# Altium footprint library HARTING THD.PcbLib: 113 footprints (part 6 of 11) (continued)
## HARTING_09 33 000 9813 [mm] "Han 6E-m PCB Matrix With Contacts"
height 26
pads (6):
  round 2.5 hole 1.8: 1(0.3,10.5) 2(-2.8,5.1) 3(2.8,2.65) 4(-2.8,-2.65) 5(2.8,-5.1) 6(-0.3,-10.5)
Top Overlay:
  circle w0.2: c0.3,10.5 r2.25
  circle w0.2: c0.3,10.5 r2.6
  circle w0.2: c-2.8,5.1 r2.25
  circle w0.2: c-2.8,5.1 r2.6
  circle w0.2: c2.8,2.65 r2.25
  circle w0.2: c2.8,2.65 r2.6
  circle w0.2: c-2.8,-2.65 r2.25
  circle w0.2: c-2.8,-2.65 r2.6
  circle w0.2: c2.8,-5.1 r2.25
  circle w0.2: c2.8,-5.1 r2.6
  circle w0.2: c-0.3,-10.5 r2.25
  circle w0.2: c-0.3,-10.5 r2.6
  circle w0.2: c-5.5,13.35 r1
  lines w0.2: -7.3,-15.15 7.3,-15.15 7.3,15.15 -7.3,15.15 -7.3,-15.15
  text "1" at -4.593,9.824 h1.2
  text "6" at -5.193,-11.276 h1.2
Bottom Overlay:
  text "1" at -4.318,9.824 h1.2
  text "6" at -4.418,-11.276 h1.2
Mechanical 8:
  lines w0.1: -3.3,-2.65 -2.8,-2.65 ; -3.3,5.1 -2.8,5.1 ; -2.8,-3.15 -2.8,-2.65 ; -2.8,-2.15 -2.8,-2.65 ; -2.8,4.6 -2.8,5.1 ; -2.8,5.6 -2.8,5.1 ; -2.3,-2.65 -2.8,-2.65 ; -2.3,5.1 -2.8,5.1 ; -0.8,-10.5 -0.3,-10.5 ; -0.5,0 0,0 ; -0.3,-11 -0.3,-10.5 ; -0.3,-10 -0.3,-10.5 ; -0.2,10.5 0.3,10.5 ; 0,-0.5 0,0 ; 0,0.5 0,0 ; 0.2,-10.5 -0.3,-10.5 ; 0.3,10 0.3,10.5 ; 0.3,11 0.3,10.5 ; 0.5,0 0,0 ; 0.8,10.5 0.3,10.5 ; 2.3,-5.1 2.8,-5.1 ; 2.3,2.65 2.8,2.65 ; 2.8,-5.6 2.8,-5.1 ; 2.8,-4.6 2.8,-5.1 ; 2.8,2.15 2.8,2.65 ; 2.8,3.15 2.8,2.65 ; 3.3,-5.1 2.8,-5.1 ; 3.3,2.65 2.8,2.65
Mechanical 14:
  circle w0.1: c0.3,10.5 r2.25
  circle w0.1: c0.3,10.5 r2.6
  circle w0.1: c-2.8,5.1 r2.25
  circle w0.1: c-2.8,5.1 r2.6
  circle w0.1: c2.8,2.65 r2.25
  circle w0.1: c2.8,2.65 r2.6
  circle w0.1: c-2.8,-2.65 r2.25
  circle w0.1: c-2.8,-2.65 r2.6
  circle w0.1: c2.8,-5.1 r2.25
  circle w0.1: c2.8,-5.1 r2.6
  circle w0.1: c-0.3,-10.5 r2.25
  circle w0.1: c-0.3,-10.5 r2.6
  circle w0.1: c-5.5,13.35 r1
  lines w0.1: -7.3,-15.15 7.3,-15.15 7.3,15.15 -7.3,15.15 -7.3,-15.15
  text "1" at -4.593,9.824 h1.2
  text "6" at -5.193,-11.276 h1.2
3D body "HARTING_09 33 000 9813.stp": height 26, standoff -4.6, extent -7.3,-15.15 7.3,15.15

## HARTING_09 33 000 9815 [mm] "Han 32EE-m PCB Matrix With Contacts"
height 26
pads (26):
  round 2.5 hole 1.8: 1(-9.207,24.026) 2(-9.207,18.026) 3(-9.207,12.026) 4(-9.207,6.026) 7(-9.207,-11.974) 8(-9.207,-17.974) 9(-9.207,-23.974) 10(-3.007,22.226) 11(-3.007,14.526) 12(-3.007,6.826) 14(-3.007,-8.574) 15(-3.007,-16.274) 16(-3.007,-23.974) 17(2.993,22.226) 18(2.993,14.526) 19(2.993,6.826) 21(2.993,-8.574) 22(2.993,-16.274) 23(2.993,-23.974) 24(9.193,24.026) 25(9.193,18.026) 26(9.193,12.026) 27(9.193,6.026) 30(9.193,-11.974) 31(9.193,-17.974) 32(9.193,-23.974)
Top Overlay:
  circle w0.2: c-14.2,30.2 r1
  circle w0.2: c-9.207,18.026 r2.6
  circle w0.2: c-9.207,18.026 r2.25
  circle w0.2: c-9.207,-23.974 r2.6
  circle w0.2: c-9.207,-17.974 r2.6
  circle w0.2: c-9.207,-11.974 r2.6
  circle w0.2: c-3.007,-8.574 r2.6
  circle w0.2: c-3.007,-16.274 r2.6
  circle w0.2: c-3.007,-23.974 r2.6
  circle w0.2: c2.993,-23.974 r2.6
  circle w0.2: c2.993,-16.274 r2.6
  circle w0.2: c9.193,-23.974 r2.6
  circle w0.2: c9.193,-17.974 r2.6
  circle w0.2: c9.193,-11.974 r2.6
  circle w0.2: c2.993,-8.574 r2.6
  circle w0.2: c-9.207,6.026 r2.6
  circle w0.2: c-3.007,6.826 r2.6
  circle w0.2: c-9.207,12.026 r2.6
  circle w0.2: c-3.007,14.526 r2.6
  circle w0.2: c2.993,14.526 r2.6
  circle w0.2: c2.993,6.826 r2.6
  circle w0.2: c9.193,6.026 r2.6
  circle w0.2: c9.193,12.026 r2.6
  circle w0.2: c9.193,18.026 r2.6
  circle w0.2: c9.193,24.026 r2.6
  circle w0.2: c2.993,22.226 r2.6
  circle w0.2: c-3.007,22.226 r2.6
  circle w0.2: c-9.207,24.026 r2.6
  circle w0.2: c-9.207,24.026 r2.25
  circle w0.2: c-3.007,22.226 r2.25
  circle w0.2: c2.993,22.226 r2.25
  circle w0.2: c9.193,24.026 r2.25
  circle w0.2: c9.193,18.026 r2.25
  circle w0.2: c2.993,14.526 r2.25
  circle w0.2: c9.193,12.026 r2.25
  circle w0.2: c-3.007,14.526 r2.25
  circle w0.2: c-9.207,12.026 r2.25
  circle w0.2: c-9.207,6.026 r2.25
  circle w0.2: c-3.007,6.826 r2.25
  circle w0.2: c2.993,6.826 r2.25
  circle w0.2: c9.193,6.026 r2.25
  circle w0.2: c2.993,-8.574 r2.25
  circle w0.2: c-3.007,-8.574 r2.25
  circle w0.2: c-9.207,-11.974 r2.25
  circle w0.2: c9.193,-11.974 r2.25
  circle w0.2: c9.193,-17.974 r2.25
  circle w0.2: c2.993,-16.274 r2.25
  circle w0.2: c-3.007,-16.274 r2.25
  circle w0.2: c-9.207,-17.974 r2.25
  circle w0.2: c-9.207,-23.974 r2.25
  circle w0.2: c-3.007,-23.974 r2.25
  circle w0.2: c2.993,-23.974 r2.25
  circle w0.2: c9.193,-23.974 r2.25
  lines w0.2: -16,-32 -16,32 16,32 16,-32 -16,-32
  text "7" at -9.575,-8.101 h1.2
  text "30" at 8.225,-8.101 h1.2
  text "4" at -9.525,0.974 h1.2
  text "27" at 8.225,0.974 h1.2
  text "24" at 8.225,27.899 h1.2
  text "9" at -9.525,-29.026 h1.2
  text "32" at 8.225,-29.026 h1.2
  text "1" at -9.525,27.75 h1.2
  text "16" at -3.975,-29.026 h1.2
  text "23" at 2.025,-29.026 h1.2
  text "17" at 2.025,26.099 h1.2
  text "10" at -3.975,26.099 h1.2
  text "19" at 2.025,1.774 h1.2
  text "12" at -3.975,1.774 h1.2
  text "14" at -3.725,-4.701 h1.2
  text "21" at 2.025,-4.701 h1.2
Bottom Overlay:
  text "7" at -8.8,-8.125 h1.2
  text "30" at 9.95,-8.125 h1.2
  text "4" at -8.65,0.949 h1.2
  text "27" at 9.875,0.974 h1.2
  text "24" at 10.175,27.899 h1.2
  text "9" at -8.775,-29.026 h1.2
  text "32" at 10.1,-29.026 h1.2
  text "21" at 3.75,-4.725 h1.2
  text "14" at -2.25,-4.675 h1.2
  text "12" at -2.35,1.774 h1.2
  text "19" at 3.675,1.774 h1.2
  text "10" at -2.025,26.099 h1.2
  text "17" at 3.975,26.099 h1.2
  text "23" at 3.9,-29.026 h1.2
  text "16" at -2.275,-29.026 h1.2
  text "1" at -8.664,27.75 h1.2
Mechanical 8:
  lines w0.1: -9.707,-23.974 -9.207,-23.974 ; -9.707,-17.974 -9.207,-17.974 ; -9.707,-11.974 -9.207,-11.974 ; -9.707,6.026 -9.207,6.026 ; -9.707,12.026 -9.207,12.026 ; -9.707,18.026 -9.207,18.026 ; -9.707,24.026 -9.207,24.026 ; -9.207,-24.474 -9.207,-23.974 ; -9.207,-23.474 -9.207,-23.974 ; -9.207,-18.474 -9.207,-17.974 ; -9.207,-17.474 -9.207,-17.974 ; -9.207,-12.474 -9.207,-11.974 ; -9.207,-11.474 -9.207,-11.974 ; -9.207,5.526 -9.207,6.026 ; -9.207,6.526 -9.207,6.026 ; -9.207,11.526 -9.207,12.026 ; -9.207,12.526 -9.207,12.026 ; -9.207,17.526 -9.207,18.026 ; -9.207,18.526 -9.207,18.026 ; -9.207,23.526 -9.207,24.026 ; -9.207,24.526 -9.207,24.026 ; -8.707,-23.974 -9.207,-23.974 ; -8.707,-17.974 -9.207,-17.974 ; -8.707,-11.974 -9.207,-11.974 ; -8.707,6.026 -9.207,6.026 ; -8.707,12.026 -9.207,12.026 ; -8.707,18.026 -9.207,18.026 ; -8.707,24.026 -9.207,24.026 ; -3.507,-23.974 -3.007,-23.974 ; -3.507,-16.274 -3.007,-16.274 ; -3.507,-8.574 -3.007,-8.574 ; -3.507,6.826 -3.007,6.826 ; -3.507,14.526 -3.007,14.526 ; -3.507,22.226 -3.007,22.226 ; -3.007,-24.474 -3.007,-23.974 ; -3.007,-23.474 -3.007,-23.974 ; -3.007,-16.774 -3.007,-16.274 ; -3.007,-15.774 -3.007,-16.274 ; -3.007,-9.074 -3.007,-8.574 ; -3.007,-8.074 -3.007,-8.574 ; -3.007,6.326 -3.007,6.826 ; -3.007,7.326 -3.007,6.826 ; -3.007,14.026 -3.007,14.526 ; -3.007,15.026 -3.007,14.526 ; -3.007,21.726 -3.007,22.226 ; -3.007,22.726 -3.007,22.226 ; -2.507,-23.974 -3.007,-23.974 ; -2.507,-16.274 -3.007,-16.274 ; -2.507,-8.574 -3.007,-8.574 ; -2.507,6.826 -3.007,6.826 ; -2.507,14.526 -3.007,14.526 ; -2.507,22.226 -3.007,22.226 ; -0.5,0 0,0 ; 0,-0.5 0,0 ; 0,0.5 0,0 ; 0.5,0 0,0 ; 2.493,-23.974 2.993,-23.974 ; 2.493,-16.274 2.993,-16.274 ; 2.493,-8.574 2.993,-8.574 ; 2.493,6.826 2.993,6.826 ; 2.493,14.526 2.993,14.526 ; 2.493,22.226 2.993,22.226 ; 2.993,-24.474 2.993,-23.974 ; 2.993,-23.474 2.993,-23.974 ; 2.993,-16.774 2.993,-16.274 ; 2.993,-15.774 2.993,-16.274 ; 2.993,-9.074 2.993,-8.574 ; 2.993,-8.074 2.993,-8.574 ; 2.993,6.326 2.993,6.826 ; 2.993,7.326 2.993,6.826 ; 2.993,14.026 2.993,14.526 ; 2.993,15.026 2.993,14.526 ; 2.993,21.726 2.993,22.226 ; 2.993,22.726 2.993,22.226 ; 3.493,-23.974 2.993,-23.974 ; 3.493,-16.274 2.993,-16.274 ; 3.493,-8.574 2.993,-8.574 ; 3.493,6.826 2.993,6.826 ; 3.493,14.526 2.993,14.526 ; 3.493,22.226 2.993,22.226 ; 8.693,-23.974 9.193,-23.974 ; 8.693,-17.974 9.193,-17.974 ; 8.693,-11.974 9.193,-11.974 ; 8.693,6.026 9.193,6.026 ; 8.693,12.026 9.193,12.026 ; 8.693,18.026 9.193,18.026 ; 8.693,24.026 9.193,24.026 ; 9.193,-24.474 9.193,-23.974 ; 9.193,-23.474 9.193,-23.974 ; 9.193,-18.474 9.193,-17.974 ; 9.193,-17.474 9.193,-17.974 ; 9.193,-12.474 9.193,-11.974 ; 9.193,-11.474 9.193,-11.974 ; 9.193,5.526 9.193,6.026 ; 9.193,6.526 9.193,6.026 ; 9.193,11.526 9.193,12.026 ; 9.193,12.526 9.193,12.026 ; 9.193,17.526 9.193,18.026 ; 9.193,18.526 9.193,18.026 ; 9.193,23.526 9.193,24.026 ; 9.193,24.526 9.193,24.026 ; 9.693,-23.974 9.193,-23.974 ; 9.693,-17.974 9.193,-17.974 ; 9.693,-11.974 9.193,-11.974 ; 9.693,6.026 9.193,6.026 ; 9.693,12.026 9.193,12.026 ; 9.693,18.026 9.193,18.026 ; 9.693,24.026 9.193,24.026
Mechanical 14:
  circle w0.1: c-14.2,30.2 r1
  circle w0.1: c9.193,-11.974 r2.6
  circle w0.1: c9.193,-17.974 r2.6
  circle w0.1: c9.193,-23.974 r2.6
  circle w0.1: c2.993,-23.974 r2.6
  circle w0.1: c2.993,-16.274 r2.6
  circle w0.1: c-3.007,-16.274 r2.6
  circle w0.1: c-3.007,-23.974 r2.6
  circle w0.1: c-9.207,-23.974 r2.6
  circle w0.1: c-9.207,-17.974 r2.6
  circle w0.1: c-9.207,-11.974 r2.6
  circle w0.1: c2.993,-8.574 r2.6
  circle w0.1: c-3.007,-8.574 r2.6
  circle w0.1: c-9.207,6.026 r2.6
  circle w0.1: c-3.007,6.826 r2.6
  circle w0.1: c2.993,6.826 r2.6
  circle w0.1: c9.193,6.026 r2.6
  circle w0.1: c9.193,12.026 r2.6
  circle w0.1: c9.193,24.026 r2.6
  circle w0.1: c9.193,18.026 r2.6
  circle w0.1: c-9.207,12.026 r2.6
  circle w0.1: c2.993,14.526 r2.6
  circle w0.1: c-3.007,14.526 r2.6
  circle w0.1: c2.993,22.226 r2.6
  circle w0.1: c-3.007,22.226 r2.6
  circle w0.1: c-9.207,18.026 r2.6
  circle w0.1: c-9.207,18.026 r2.25
  circle w0.1: c-9.207,-23.974 r2.25
  circle w0.1: c-9.207,-17.974 r2.25
  circle w0.1: c-9.207,-11.974 r2.25
  circle w0.1: c-3.007,-8.574 r2.25
  circle w0.1: c-3.007,-16.274 r2.25
  circle w0.1: c-3.007,-23.974 r2.25
  circle w0.1: c2.993,-23.974 r2.25
  circle w0.1: c2.993,-16.274 r2.25
  circle w0.1: c9.193,-23.974 r2.25
  circle w0.1: c9.193,-17.974 r2.25
  circle w0.1: c9.193,-11.974 r2.25
  circle w0.1: c2.993,-8.574 r2.25
  circle w0.1: c-9.207,6.026 r2.25
  circle w0.1: c-3.007,6.826 r2.25
  circle w0.1: c-3.007,14.526 r2.25
  circle w0.1: c2.993,14.526 r2.25
  circle w0.1: c2.993,6.826 r2.25
  circle w0.1: c9.193,6.026 r2.25
  circle w0.1: c9.193,12.026 r2.25
  circle w0.1: c9.193,18.026 r2.25
  circle w0.1: c9.193,24.026 r2.25
  circle w0.1: c2.993,22.226 r2.25
  circle w0.1: c-3.007,22.226 r2.25
  circle w0.1: c-9.207,24.026 r2.6
  circle w0.1: c-9.207,24.026 r2.25
  circle w0.1: c-9.207,12.026 r2.25
  lines w0.1: -16,-32 -16,32 16,32 16,-32 -16,-32
  text "7" at -9.575,-8.101 h1.2
  text "30" at 8.225,-8.101 h1.2
  text "4" at -9.525,0.974 h1.2
  text "27" at 8.225,0.974 h1.2
  text "24" at 8.225,27.899 h1.2
  text "9" at -9.525,-29.026 h1.2
  text "32" at 8.225,-29.026 h1.2
  text "1" at -9.525,27.75 h1.2
  text "16" at -3.975,-29.026 h1.2
  text "23" at 2.025,-29.026 h1.2
  text "17" at 2.025,26.099 h1.2
  text "10" at -3.975,26.099 h1.2
  text "19" at 2.025,1.774 h1.2
  text "12" at -3.975,1.774 h1.2
  text "14" at -3.725,-4.701 h1.2
  text "21" at 2.025,-4.701 h1.2
3D body "HARTING_09 33 000 9815.stp": height 26, standoff -4.6, extent -16,-32 16,32

## HARTING_09 33 000 9996 [mm] "6 Positions, PC Board Adaptor For Han E® Module"
height 23
pads (2):
  round 2.5 hole 1.8: 1(-3.75,0) 2(3.75,0)
Top Overlay:
  circle w0.2: c3.75,0 r2.25
  circle w0.2: c3.75,0 r2.45
  circle w0.2: c-3.75,0 r2.25
  circle w0.2: c-3.75,0 r2.45
  lines w0.2: -8.727,-4.285 cw(c-8.65,-4.1) -8.727,-3.915 ; -8.4,-3.35 -8.4,-3.466 ; -8.1,-3.35 -8.1,-3.661 ; -7.9,-3.35 -7.9,-3.661 ; -7.6,-3.35 -7.6,-3.466 ; -7.273,-4.285 ccw(c-7.35,-4.1) -7.273,-3.915 ; -6.45,3.35 -6.45,4.35 -1.75,4.35 -1.75,3.35 ; 1.75,3.35 1.75,4.35 6.45,4.35 6.45,3.35 ; 7.273,-4.285 cw(c7.35,-4.1) 7.273,-3.915 ; 7.6,-3.35 7.6,-3.466 ; 7.9,-3.35 7.9,-3.661 ; 8.1,-3.35 8.1,-3.661 ; 8.4,-3.35 8.4,-3.466 ; 8.727,-4.285 ccw(c8.65,-4.1) 8.727,-3.915 ; -8.4,-3.466 cw(c-9.479,-5.447) -8.1,-3.661 ; -8.4,-3.466 ccw(c-8,-4.1) -7.6,-3.466 ; -8.1,-3.661 ccw(c-8,-4.1) -7.9,-3.661 ; -7.9,-3.661 cw(c-6.785,-5.043) -7.6,-3.466 ; 7.6,-3.466 cw(c6.785,-5.043) 7.9,-3.661 ; 7.6,-3.466 ccw(c8,-4.1) 8.4,-3.466 ; 7.9,-3.661 ccw(c8,-4.1) 8.1,-3.661 ; 8.1,-3.661 cw(c9.479,-5.447) 8.4,-3.466 ; -13,-3.35 -13,3.35 13,3.35 13,-3.35 -13,-3.35
  text "1" at -7.3,-0.6 h1.2
Mechanical 8:
  lines w0.1: -4.25,0 -3.75,0 ; -3.75,-0.5 -3.75,0 ; -3.75,0.5 -3.75,0 ; -3.25,0 -3.75,0 ; -0.5,0 0,0 ; 0,-0.5 0,0 ; 0,0.5 0,0 ; 0.5,0 0,0 ; 3.25,0 3.75,0 ; 3.75,-0.5 3.75,0 ; 3.75,0.5 3.75,0 ; 4.25,0 3.75,0
Mechanical 14:
  circle w0.1: c3.75,0 r1.35
  circle w0.1: c3.75,0 r2.25
  circle w0.1: c3.75,0 r2.45
  circle w0.1: c3.75,0 r1.25
  circle w0.1: c-3.75,0 r1.35
  circle w0.1: c-3.75,0 r2.25
  circle w0.1: c-3.75,0 r2.45
  circle w0.1: c-3.75,0 r1.25
  lines w0.1: -8.727,-4.285 cw(c-8.65,-4.1) -8.727,-3.915 ; -8.4,-3.35 -8.4,-3.466 ; -8.1,-3.35 -8.1,-3.661 ; -7.9,-3.35 -7.9,-3.661 ; -7.6,-3.35 -7.6,-3.466 ; -7.273,-4.285 ccw(c-7.35,-4.1) -7.273,-3.915 ; -6.45,3.35 -6.45,4.35 -1.75,4.35 -1.75,3.35 ; 1.75,3.35 1.75,4.35 6.45,4.35 6.45,3.35 ; 7.273,-4.285 cw(c7.35,-4.1) 7.273,-3.915 ; 7.6,-3.35 7.6,-3.466 ; 7.9,-3.35 7.9,-3.661 ; 8.1,-3.35 8.1,-3.661 ; 8.4,-3.35 8.4,-3.466 ; 8.727,-4.285 ccw(c8.65,-4.1) 8.727,-3.915 ; -8.4,-3.466 cw(c-9.479,-5.447) -8.1,-3.661 ; -8.4,-3.466 ccw(c-8,-4.1) -7.6,-3.466 ; -8.1,-3.661 ccw(c-8,-4.1) -7.9,-3.661 ; -7.9,-3.661 cw(c-6.785,-5.043) -7.6,-3.466 ; 7.6,-3.466 cw(c6.785,-5.043) 7.9,-3.661 ; 7.6,-3.466 ccw(c8,-4.1) 8.4,-3.466 ; 7.9,-3.661 ccw(c8,-4.1) 8.1,-3.661 ; 8.1,-3.661 cw(c9.479,-5.447) 8.4,-3.466 ; -13,-3.35 -13,3.35 13,3.35 13,-3.35 -13,-3.35
  text "1" at -7.3,-0.6 h1.2
3D body "HARTING_09 33 000 9996.stp": height 23, standoff -4.6, extent -13,-4.85 13,4.35

## HARTING_09 56 551 7513 [mm] "High Density Straight Female D-SUB 78 Contacts, with Grounding Board Locks and Female Screw Lock 4-40"
height 12.7
pads (80):
  round 1.7 hole 1: 1(22.895,3.12) 2(20.485,3.12) 3(18.075,3.12) 4(15.665,3.12) 5(13.255,3.12) 6(10.845,3.12) 7(8.435,3.12) 8(6.025,3.12) 9(3.615,3.12) 10(1.205,3.12) 11(-1.205,3.12) 12(-3.615,3.12) 13(-6.025,3.12) 14(-8.435,3.12) 15(-10.845,3.12) 16(-13.255,3.12) 17(-15.665,3.12) 18(-18.075,3.12) 19(-20.485,3.12) 20(-22.895,3.12) 21(21.695,1.04) 22(19.285,1.04) 23(16.875,1.04) 24(14.465,1.04) 25(12.055,1.04) 26(9.645,1.04) 27(7.235,1.04) 28(4.825,1.04) 29(2.415,1.04) 30(0.005,1.04) 31(-2.405,1.04) 32(-4.815,1.04) 33(-7.225,1.04) 34(-9.635,1.04) 35(-12.045,1.04) 36(-14.455,1.04) 37(-16.865,1.04) 38(-19.275,1.04) 39(-21.685,1.04) 40(22.895,-1.04) 41(20.485,-1.04) 42(18.075,-1.04) 43(15.665,-1.04) 44(13.255,-1.04) 45(10.845,-1.04) 46(8.435,-1.04) 47(6.025,-1.04) 48(3.615,-1.04) 49(1.205,-1.04) 50(-1.205,-1.04) 51(-3.615,-1.04) 52(-6.025,-1.04) 53(-8.435,-1.04) 54(-10.845,-1.04) 55(-13.255,-1.04) 56(-15.665,-1.04) 57(-18.075,-1.04) 58(-20.485,-1.04) 59(-22.895,-1.04) 60(21.695,-3.12) 61(19.285,-3.12) 62(16.875,-3.12) 63(14.465,-3.12) 64(12.055,-3.12) 65(9.645,-3.12) 66(7.235,-3.12) 67(4.825,-3.12) 68(2.415,-3.12) 69(0.005,-3.12) 70(-2.405,-3.12) 71(-4.815,-3.12) 72(-7.225,-3.12) 73(-9.635,-3.12) 74(-12.045,-3.12) 75(-14.455,-3.12) 76(-16.865,-3.12) 77(-19.275,-3.12) 78(-21.685,-3.12)
  round 3.8 hole 3.1: 79(-30.55,0) 80(30.55,0)
Top Overlay:
  circle w0.2: c22.67,8.5 r0.125
  lines w0.2: -33.655,-6.375 ccw(c-32.155,-6.375) -32.155,-7.875 32.145,-7.875 ccw(c32.145,-6.375) 33.645,-6.375 33.645,6.375 ccw(c32.145,6.375) 32.145,7.875 -32.155,7.875 ccw(c-32.155,6.375) -33.655,6.375 -33.655,-6.375 ; -33.153,0 -31.854,2.25 -29.256,2.25 -27.957,0 -29.256,-2.25 -31.854,-2.25 -33.153,0 ; -26.181,2.319 cw(c-23.62,2.77) -23.62,5.37 23.61,5.37 cw(c23.61,2.77) 26.171,2.319 25.194,-3.221 cw(c22.633,-2.77) 22.633,-5.37 -22.643,-5.37 cw(c-22.643,-2.77) -25.204,-3.221 -26.181,2.319 ; -25.688,2.405 cw(c-23.62,2.77) -23.62,4.87 23.61,4.87 cw(c23.61,2.77) 25.678,2.405 24.701,-3.135 cw(c22.633,-2.77) 22.633,-4.87 -22.643,-4.87 cw(c-22.643,-2.77) -24.711,-3.135 -25.688,2.405 ; 27.947,0 29.246,-2.25 31.844,-2.25 33.143,0 31.844,2.25 29.246,2.25 27.947,0
  text "78" at -28.054,-4.032 h1.2
  text "60" at 26.246,-3.782 h1.2
  text "1" at 27.121,3.148 h1.2
  text "20" at -28.795,3.15 h1.2
Mechanical 8:
  drawing of 328 lines, arcs and shapes, not listed
Mechanical 14:
  drawing of 192 lines, arcs and shapes, not listed
  text "78" at -28.054,-4.032 h1.2
  text "1" at 27.121,3.148 h1.2
  text "60" at 26.246,-3.782 h1.2
3D body "HARTING_09 56 551 7513.stp": height 13.25, standoff -3.5, extent -33.655,-7.875 33.645,7.875

## HARTING_09 56 552 7613 [mm] "High Density Right Angle Female D-SUB 78 Contacts, with Grounding Board Locks and Female Screw Lock 4-40"
height 15.35
pads (80):
  round 1.7 hole 1: 1(-22.895,-3.81) 2(-20.485,-3.81) 3(-18.075,-3.81) 4(-15.665,-3.81) 5(-13.255,-3.81) 6(-10.845,-3.81) 7(-8.435,-3.81) 8(-6.025,-3.81) 9(-3.615,-3.81) 10(-1.205,-3.81) 11(1.205,-3.81) 12(3.615,-3.81) 13(6.025,-3.81) 14(8.435,-3.81) 15(10.845,-3.81) 16(13.255,-3.81) 17(15.665,-3.81) 18(18.075,-3.81) 19(20.485,-3.81) 20(22.895,-3.81) 21(-21.685,-1.27) 22(-19.275,-1.27) 23(-16.865,-1.27) 24(-14.455,-1.27) 25(-12.045,-1.27) 26(-9.635,-1.27) 27(-7.225,-1.27) 28(-4.815,-1.27) 29(-2.405,-1.27) 30(0.005,-1.27) 31(2.415,-1.27) 32(4.825,-1.27) 33(7.235,-1.27) 34(9.645,-1.27) 35(12.055,-1.27) 36(14.465,-1.27) 37(16.875,-1.27) 38(19.285,-1.27) 39(21.695,-1.27) 40(-22.895,1.27) 41(-20.485,1.27) 42(-18.075,1.27) 43(-15.665,1.27) 44(-13.255,1.27) 45(-10.845,1.27) 46(-8.435,1.27) 47(-6.025,1.27) 48(-3.615,1.27) 49(-1.205,1.27) 50(1.205,1.27) 51(3.615,1.27) 52(6.025,1.27) 53(8.435,1.27) 54(10.845,1.27) 55(13.255,1.27) 56(15.665,1.27) 57(18.075,1.27) 58(20.485,1.27) 59(22.895,1.27) 60(-21.685,3.81) 61(-19.275,3.81) 62(-16.865,3.81) 63(-14.455,3.81) 64(-12.045,3.81) 65(-9.635,3.81) 66(-7.225,3.81) 67(-4.815,3.81) 68(-2.405,3.81) 69(0.005,3.81) 70(2.415,3.81) 71(4.825,3.81) 72(7.235,3.81) 73(9.645,3.81) 74(12.055,3.81) 75(14.465,3.81) 76(16.875,3.81) 77(19.285,3.81) 78(21.695,3.81)
  round 4.1 hole 3.4: 79(-30.555,1.27) 80(30.565,1.27)
Top Overlay:
  circle w0.2: c-22.895,-6.01 r0.125
  lines w0.2: -33.695,7.7 -27.245,7.7 ; -33.695,9.7 33.705,9.7 ; -33.668,12.2 33.705,12.2 ; -33.35,7.7 -33.35,4.02 ccw(c-32.35,4.02) -32.35,3.02 ; -33.143,12.7 -33.143,18.7 -27.947,18.7 -27.947,12.7 ; -32.35,-5.4 -32.35,-0.397 ; -31.945,7.7 -31.945,6.5 ; -29.145,7.7 -29.145,6.5 ; -28.75,-5.4 -28.75,-0.387 ; -28.75,3.02 ccw(c-28.75,4.02) -27.75,4.02 -27.75,7.7 ; -27.245,-5.4 -27.245,9.7 ; -26.172,12.7 -26.172,18.3 cw(c-25.672,18.3) -25.672,18.8 25.682,18.8 cw(c25.682,18.3) 26.182,18.3 26.182,12.7 ; 27.255,-5.4 27.255,9.7 ; 27.255,7.7 33.705,7.7 ; 27.77,7.7 27.77,4.02 ccw(c28.77,4.02) 28.77,3.02 ; 27.957,12.7 27.957,18.7 33.153,18.7 33.153,12.7 ; 28.77,-5.4 28.77,-0.397 ; 29.175,7.7 29.175,6.5 ; 31.975,7.7 31.975,6.5 ; 32.37,-5.4 32.37,-0.387 ; 32.37,3.02 ccw(c32.37,4.02) 33.37,4.02 33.37,7.7 ; -31.945,6.5 -31.645,6.2 -29.445,6.2 -29.145,6.5 ; -31.945,6.5 -29.145,6.5 ; 29.175,6.5 29.475,6.2 31.675,6.2 31.975,6.5 ; 29.175,6.5 31.975,6.5 ; -33.695,-5.4 33.705,-5.4 33.705,12.7 -33.695,12.7 -33.695,-5.4
  text "1" at -26.554,-4.377 h1.2
  text "40" at -26.554,0.703 h1.2
  text "60" at -26.604,3.153 h1.2
  text "21" at -26.604,-1.927 h1.2
  text "39" at 24.621,-1.897 h1.2
  text "20" at 24.696,-4.437 h1.2
  text "59" at 24.696,0.643 h1.2
  text "78" at 24.621,3.183 h1.2
Mechanical 8:
  drawing of 326 lines, arcs and shapes, not listed
Mechanical 14:
  lines w0.1: -33.695,7.7 -27.245,7.7 ; -33.695,9.7 33.705,9.7 ; -33.668,12.2 33.705,12.2 ; -33.35,7.7 -33.35,4.02 ccw(c-32.35,4.02) -32.35,3.02 ; -33.143,12.7 -33.143,18.7 -27.947,18.7 -27.947,12.7 ; -32.35,-5.4 -32.35,3.02 ; -32.35,0.55 ccw(c-30.55,0.55) -28.75,0.55 ; -32.35,2.05 cw(c-30.55,2.05) -32.066,3.02 ; -32.06,1.47 -32.255,1.47 -32.255,1.07 -32.06,1.07 ; -32.06,3.02 -32.06,1.07 ; -31.945,7.7 -31.945,6.5 ; -29.145,7.7 -29.145,6.5 ; -29.04,1.47 -28.835,1.47 -28.835,1.07 -29.04,1.07 ; -29.04,3.02 -29.04,1.07 ; -29.034,3.02 cw(c-30.55,2.05) -28.75,2.05 ; -28.75,-5.4 -28.75,3.02 ; -27.75,7.7 -27.75,4.02 cw(c-28.75,4.02) -28.75,3.02 ; -27.245,-5.4 -27.245,9.7 ; -26.172,12.7 -26.172,18.3 cw(c-25.672,18.3) -25.672,18.8 25.682,18.8 cw(c25.682,18.3) 26.182,18.3 26.182,12.7 ; 27.255,-5.4 27.255,9.7 ; 27.255,7.7 33.705,7.7 ; 27.77,7.7 27.77,4.02 ccw(c28.77,4.02) 28.77,3.02 ; 27.957,12.7 27.957,18.7 33.153,18.7 33.153,12.7 ; 28.77,-5.4 28.77,3.02 ; 28.77,0.55 ccw(c30.57,0.55) 32.37,0.55 ; 28.77,2.05 cw(c30.57,2.05) 29.054,3.02 ; 29.06,1.47 28.865,1.47 28.865,1.07 29.06,1.07 ; 29.06,3.02 29.06,1.07 ; 29.175,7.7 29.175,6.5 ; 31.975,7.7 31.975,6.5 ; 32.08,1.47 32.285,1.47 32.285,1.07 32.08,1.07 ; 32.08,3.02 32.08,1.07 ; 32.086,3.02 cw(c30.57,2.05) 32.37,2.05 ; 32.37,-5.4 32.37,3.02 ; 33.37,7.7 33.37,4.02 cw(c32.37,4.02) 32.37,3.02 ; -32.35,3.02 -28.75,3.02 ; -32.06,1.07 -29.04,1.07 ; -31.945,6.5 -31.645,6.2 -29.445,6.2 -29.145,6.5 ; -31.945,6.5 -29.145,6.5 ; 28.77,3.02 32.37,3.02 ; 29.06,1.07 32.08,1.07 ; 29.175,6.5 29.475,6.2 31.675,6.2 31.975,6.5 ; 29.175,6.5 31.975,6.5 ; -33.695,-5.4 33.705,-5.4 33.705,12.7 -33.695,12.7 -33.695,-5.4
  text "40" at -26.554,0.703 h1.2
  text "60" at -26.604,3.153 h1.2
  text "21" at -26.604,-1.927 h1.2
  text "39" at 24.621,-1.897 h1.2
  text "20" at 24.696,-4.437 h1.2
  text "59" at 24.696,0.643 h1.2
  text "78" at 24.621,3.183 h1.2
  text "1" at -26.554,-4.377 h1.2
3D body "HARTING_ 09 56 552 7613.stp": height 15.75, standoff -4, extent -33.695,-5.4 33.705,18.8

## HARTING_09 56 561 7713 [mm] "High Density Straight Male D-SUB 78 Contacts, with Grounding Board Locks and Female Screw Lock 4-40"
height 13.1
pads (80):
  round 1.7 hole 1: 1(-22.9,3.12) 2(-20.49,3.12) 3(-18.08,3.12) 4(-15.67,3.12) 5(-13.26,3.12) 6(-10.85,3.12) 7(-8.44,3.12) 8(-6.03,3.12) 9(-3.62,3.12) 10(-1.21,3.12) 11(1.2,3.12) 12(3.61,3.12) 13(6.02,3.12) 14(8.43,3.12) 15(10.84,3.12) 16(13.25,3.12) 17(15.66,3.12) 18(18.07,3.12) 19(20.48,3.12) 20(22.89,3.12) 21(-21.69,1.04) 22(-19.28,1.04) 23(-16.87,1.04) 24(-14.46,1.04) 25(-12.05,1.04) 26(-9.64,1.04) 27(-7.23,1.04) 28(-4.82,1.04) 29(-2.41,1.04) 30(0,1.04) 31(2.41,1.04) 32(4.82,1.04) 33(7.23,1.04) 34(9.64,1.04) 35(12.05,1.04) 36(14.46,1.04) 37(16.87,1.04) 38(19.28,1.04) 39(21.69,1.04) 40(-22.9,-1.04) 41(-20.49,-1.04) 42(-18.08,-1.04) 43(-15.67,-1.04) 44(-13.26,-1.04) 45(-10.85,-1.04) 46(-8.44,-1.04) 47(-6.03,-1.04) 48(-3.62,-1.04) 49(-1.21,-1.04) 50(1.2,-1.04) 51(3.61,-1.04) 52(6.02,-1.04) 53(8.43,-1.04) 54(10.84,-1.04) 55(13.25,-1.04) 56(15.66,-1.04) 57(18.07,-1.04) 58(20.48,-1.04) 59(22.89,-1.04) 60(-21.69,-3.12) 61(-19.28,-3.12) 62(-16.87,-3.12) 63(-14.46,-3.12) 64(-12.05,-3.12) 65(-9.64,-3.12) 66(-7.23,-3.12) 67(-4.82,-3.12) 68(-2.41,-3.12) 69(0,-3.12) 70(2.41,-3.12) 71(4.82,-3.12) 72(7.23,-3.12) 73(9.64,-3.12) 74(12.05,-3.12) 75(14.46,-3.12) 76(16.87,-3.12) 77(19.28,-3.12) 78(21.69,-3.12)
  round 3.8 hole 3.1: 79(-30.55,0) 80(30.55,0)
Top Overlay:
  circle w0.2: c-23.125,8.5 r0.125
  lines w0.2: -33.65,-6.375 ccw(c-32.15,-6.375) -32.15,-7.875 32.15,-7.875 ccw(c32.15,-6.375) 33.65,-6.375 33.65,6.375 ccw(c32.15,6.375) 32.15,7.875 -32.15,7.875 ccw(c-32.15,6.375) -33.65,6.375 -33.65,-6.375 ; -33.148,0 -31.849,-2.25 -29.251,-2.25 -27.952,0 -29.251,2.25 -31.849,2.25 -33.148,0 ; -26.933,2.522 cw(c-23.88,3.06) -23.88,6.16 23.88,6.16 cw(c23.88,3.06) 26.933,2.522 25.854,-3.598 cw(c22.801,-3.06) 22.801,-6.16 -22.801,-6.16 cw(c-22.801,-3.06) -25.854,-3.598 -26.933,2.522 ; -26.44,2.609 cw(c-23.88,3.06) -23.88,5.66 23.88,5.66 cw(c23.88,3.06) 26.441,2.609 25.361,-3.511 cw(c22.801,-3.06) 22.801,-5.66 -22.801,-5.66 cw(c-22.801,-3.06) -25.361,-3.511 -26.44,2.609 ; 27.952,0 29.251,-2.25 31.849,-2.25 33.148,0 31.849,2.25 29.251,2.25 27.952,0
  text "20" at 27.771,3.038 h1.2
  text "78" at 26.821,-3.917 h1.2
  text "1" at -28.1,2.5 h1.2
  text "60" at -28.75,-4.125 h1.2
Mechanical 8:
  drawing of 329 lines, arcs and shapes, not listed
Mechanical 14:
  circle w0.1: c-22.9,3.12 r0.35
  circle w0.1: c-21.69,1.04 r0.35
  circle w0.1: c-22.9,-1.04 r0.35
  circle w0.1: c-21.69,-3.12 r0.35
  circle w0.1: c-20.49,3.12 r0.35
  circle w0.1: c-19.28,1.04 r0.35
  circle w0.1: c-20.49,-1.04 r0.35
  circle w0.1: c-19.28,-3.12 r0.35
  circle w0.1: c-18.08,3.12 r0.35
  circle w0.1: c-16.87,1.04 r0.35
  circle w0.1: c-18.08,-1.04 r0.35
  circle w0.1: c-16.87,-3.12 r0.35
  circle w0.1: c-15.67,3.12 r0.35
  circle w0.1: c-14.46,1.04 r0.35
  circle w0.1: c-15.67,-1.04 r0.35
  circle w0.1: c-14.46,-3.12 r0.35
  circle w0.1: c-13.26,3.12 r0.35
  circle w0.1: c-12.05,1.04 r0.35
  circle w0.1: c-13.26,-1.04 r0.35
  circle w0.1: c-12.05,-3.12 r0.35
  circle w0.1: c-10.85,3.12 r0.35
  circle w0.1: c-9.64,1.04 r0.35
  circle w0.1: c-10.85,-1.04 r0.35
  circle w0.1: c-9.64,-3.12 r0.35
  circle w0.1: c-8.44,3.12 r0.35
  circle w0.1: c-7.23,1.04 r0.35
  circle w0.1: c-8.44,-1.04 r0.35
  circle w0.1: c-7.23,-3.12 r0.35
  circle w0.1: c-6.03,3.12 r0.35
  circle w0.1: c-4.82,1.04 r0.35
  circle w0.1: c-6.03,-1.04 r0.35
  circle w0.1: c-4.82,-3.12 r0.35
  circle w0.1: c-3.62,3.12 r0.35
  circle w0.1: c-2.41,1.04 r0.35
  circle w0.1: c-3.62,-1.04 r0.35
  circle w0.1: c-2.41,-3.12 r0.35
  circle w0.1: c-1.21,3.12 r0.35
  circle w0.1: c0,1.04 r0.35
  circle w0.1: c-1.21,-1.04 r0.35
  circle w0.1: c0,-3.12 r0.35
  circle w0.1: c1.2,3.12 r0.35
  circle w0.1: c2.41,1.04 r0.35
  circle w0.1: c1.2,-1.04 r0.35
  circle w0.1: c2.41,-3.12 r0.35
  circle w0.1: c3.61,3.12 r0.35
  circle w0.1: c4.82,1.04 r0.35
  circle w0.1: c3.61,-1.04 r0.35
  circle w0.1: c4.82,-3.12 r0.35
  circle w0.1: c6.02,3.12 r0.35
  circle w0.1: c7.23,1.04 r0.35
  circle w0.1: c6.02,-1.04 r0.35
  circle w0.1: c7.23,-3.12 r0.35
  circle w0.1: c8.43,3.12 r0.35
  circle w0.1: c9.64,1.04 r0.35
  circle w0.1: c8.43,-1.04 r0.35
  circle w0.1: c9.64,-3.12 r0.35
  circle w0.1: c10.84,3.12 r0.35
  circle w0.1: c12.05,1.04 r0.35
  circle w0.1: c10.84,-1.04 r0.35
  circle w0.1: c12.05,-3.12 r0.35
  circle w0.1: c13.25,3.12 r0.35
  circle w0.1: c14.46,1.04 r0.35
  circle w0.1: c13.25,-1.04 r0.35
  circle w0.1: c14.46,-3.12 r0.35
  circle w0.1: c15.66,3.12 r0.35
  circle w0.1: c16.87,1.04 r0.35
  circle w0.1: c15.66,-1.04 r0.35
  circle w0.1: c16.87,-3.12 r0.35
  circle w0.1: c18.07,3.12 r0.35
  circle w0.1: c19.28,1.04 r0.35
  circle w0.1: c18.07,-1.04 r0.35
  circle w0.1: c19.28,-3.12 r0.35
  circle w0.1: c20.48,3.12 r0.35
  circle w0.1: c21.69,1.04 r0.35
  circle w0.1: c20.48,-1.04 r0.35
  circle w0.1: c21.69,-3.12 r0.35
  circle w0.1: c22.89,3.12 r0.35
  circle w0.1: c22.89,-1.04 r0.35
  circle w0.1: c-30.55,0 r1.3
  circle w0.1: c30.55,0 r1.3
  lines w0.1: -33.65,-6.375 ccw(c-32.15,-6.375) -32.15,-7.875 32.15,-7.875 ccw(c32.15,-6.375) 33.65,-6.375 33.65,6.375 ccw(c32.15,6.375) 32.15,7.875 -32.15,7.875 ccw(c-32.15,6.375) -33.65,6.375 -33.65,-6.375 ; -33.148,0 -31.849,-2.25 -29.251,-2.25 -27.952,0 -29.251,2.25 -31.849,2.25 -33.148,0 ; -26.933,2.522 cw(c-23.88,3.06) -23.88,6.16 23.88,6.16 cw(c23.88,3.06) 26.933,2.522 25.854,-3.598 cw(c22.801,-3.06) 22.801,-6.16 -22.801,-6.16 cw(c-22.801,-3.06) -25.854,-3.598 -26.933,2.522 ; -26.44,2.609 cw(c-23.88,3.06) -23.88,5.66 23.88,5.66 cw(c23.88,3.06) 26.441,2.609 25.361,-3.511 cw(c22.801,-3.06) 22.801,-5.66 -22.801,-5.66 cw(c-22.801,-3.06) -25.361,-3.511 -26.44,2.609 ; 27.952,0 29.251,-2.25 31.849,-2.25 33.148,0 31.849,2.25 29.251,2.25 27.952,0
  text "20" at 27.771,3.038 h1.2
  text "78" at 26.821,-3.917 h1.2
3D body "HARTING_09 56 561 7713.stp": height 13.15, standoff -3.5, extent -33.65,-7.875 33.65,7.875